# Altium footprint library 11.Other.PcbLib: 23 footprints (part 1 of 2)
Each footprint in its own frame and in the unit in brackets; x right, y up, seen from the top. Pads: shape width x height; smd on the part's side, far side on the other; paste and mask are expansions set on the pad; w line width, h text height; cw(c..) or ccw(c..) is an arc to the next point about the centre after c.
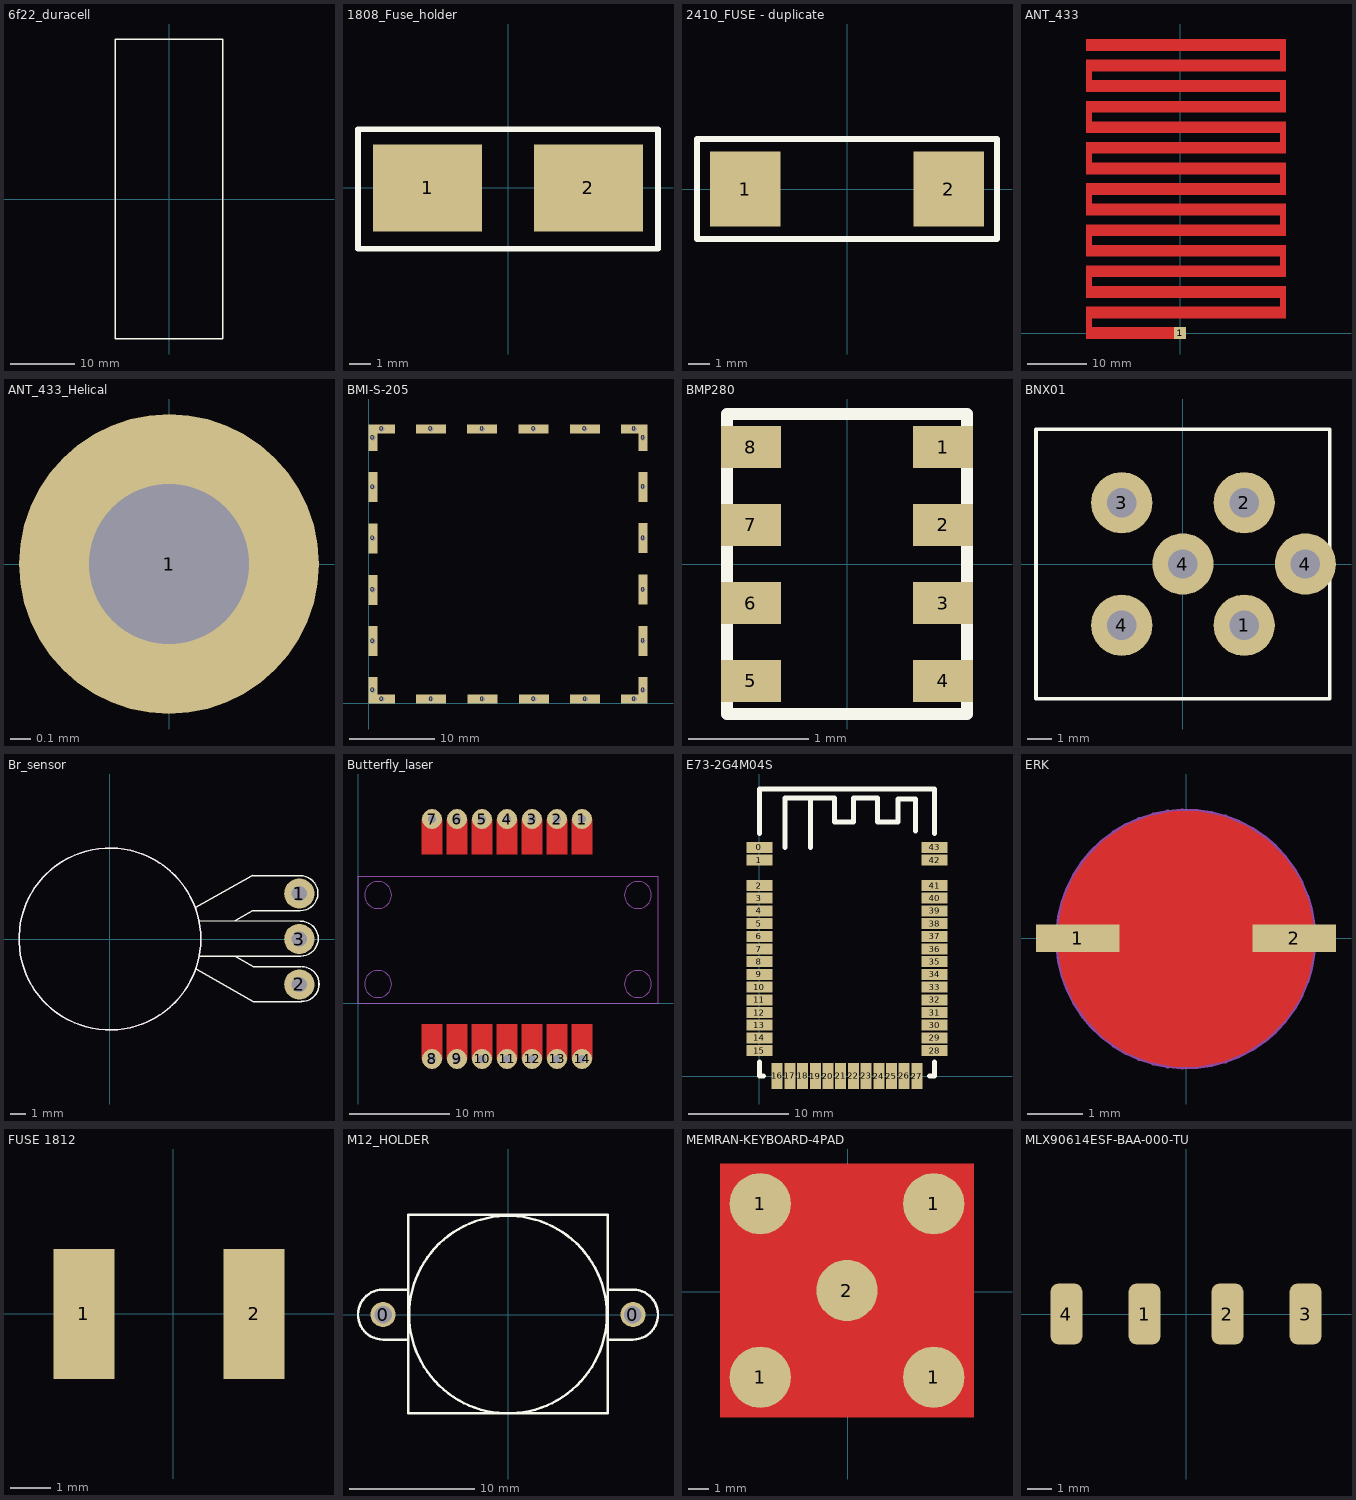
[diagram p0: the footprints below, top view; thin cyan lines are the x and y axes]

## 6f22_duracell [mm]
Top Overlay:
  lines w0.2: -8.4,-21.7 8.3,-21.7 8.3,24.8 -8.4,24.8 -8.4,-21.7
3D body "User Library-9V Duracell Battery.STEP": height 26, standoff 0, extent -8.3,-21.71 8.3,24.8

## 1808_Fuse_holder [mm]
pads (2):
  rect 5x4 smd: 1(-3.7,0) 2(3.7,0)
Top Overlay:
  lines w0.254: -6.9,-2.8 6.9,-2.8 6.9,2.7 -6.9,2.7 -6.9,-2.8
3D body: height 3.81, standoff 0.2, extent -5.3,-2.7 5.3,2.7

## 2410_FUSE - duplicate [mm]
pads (2):
  rect 3.25x3.43 smd: 1(-4.675,0) 2(4.675,0)
Top Overlay:
  lines w0.254: -6.9,-2.3 -6.9,2.3 6.9,2.3 6.9,-2.3 -6.9,-2.3
3D body: height 3.81, standoff 0.2, extent -5.3,-2.7 5.3,2.7

## ANT_433 [mm]
pads (1):
  rect 2x2 smd mask+0.102: 1(0,0)
Top Layer:
  rectangle: -16,2.5 18,4.5
  rectangle: -16,0.5 -15,3
  rectangle: -16,-1 1,1
  rectangle: 17.001,4.061 18.001,6.561
  rectangle: -16,9.5 18,11.5
  rectangle: -16,7.5 -15,10
  rectangle: -16,6 18,8
  rectangle: 17.001,11.061 18.001,13.561
  rectangle: -16,16.5 18,18.5
  rectangle: -16,14.5 -15,17
  rectangle: -16,13 18,15
  rectangle: 17.001,18.061 18.001,20.561
  rectangle: -16,23.5 18,25.5
  rectangle: -16,21.5 -15,24
  rectangle: -16,20 18,22
  rectangle: 17.001,25.061 18.001,27.561
  rectangle: -16,30.5 18,32.5
  rectangle: -16,28.5 -15,31
  rectangle: -16,27 18,29
  rectangle: 17.001,32.061 18.001,34.561
  rectangle: -16,37.5 18,39.5
  rectangle: -16,35.5 -15,38
  rectangle: -16,34 18,36
  rectangle: 17.001,39.061 18.001,41.561
  rectangle: -16,44.5 18,46.5
  rectangle: -16,42.5 -15,45
  rectangle: -16,41 18,43
  rectangle: 17.001,46.061 18.001,48.561
  rectangle: -16,48 18,50

## ANT_433_Helical [mm]
pads (1):
  round 1.5 hole 0.8: 1(0,0)
3D body "User Library-433MHz Antenna Bended.step": height 8.52, standoff 1.27, extent -3.561,-0.5 3.561,51.699

## BMI-S-205 [mm] "BMI-S-205"
pads (24):
  rect 1x3.05 / inner round 1 / far side round 1 hole 0.6: 0(0.5,1.525) 0(0.5,31) 0(32.025,1.525) 0(32.025,31)
  rect 1x3.5 / inner round 1 / far side round 1 hole 0.6: 0(0.5,7.25) 0(0.5,13.25) 0(0.5,19.25) 0(0.5,25.25) 0(32.025,7.275) 0(32.025,13.275) 0(32.025,19.275) 0(32.025,25.275)
  rect 3.05x1 / inner round 1 / far side round 1 hole 0.6: 0(1.525,32.025) 0(1.55,0.5) 0(31,0.5) 0(31,32.025)
  rect 3.5x1 / inner round 1 / far side round 1 hole 0.6: 0(7.25,32.025) 0(7.275,0.5) 0(13.25,32.025) 0(13.275,0.5) 0(19.25,32.025) 0(19.275,0.5) 0(25.25,32.025) 0(25.275,0.5)
3D body "Laird-BMI-S-204-F  AND  BMI-S-204-C.STEP": height 19, standoff 0, extent 0.1,-0.185 32.71,32.425

## BMP280 [mm]
pads (8):
  rect 0.5x0.35 smd: 1(0.8,0.975) 2(0.8,0.325) 3(0.8,-0.325) 4(0.8,-0.975) 5(-0.8,-0.975) 6(-0.8,-0.325) 7(-0.8,0.325) 8(-0.8,0.975)
Top Overlay:
  lines w0.1: -1,-1.25 -1,1.25 1,1.25 1,-1.25 -1,-1.25
Mechanical 13:
  lines w0.1: -1,-1.25 -1,1.25 1,1.25 1,-1.25 -1,-1.25
3D body "Деталь1.STEP": height 0.95, standoff -0.01, extent -1,-1.25 1,1.25

## BNX01 [mm]
pads (6):
  round 2.5 hole 1.2: 1(2.5,-2.5) 2(2.5,2.5) 3(-2.5,2.5) 4(-2.5,-2.5) 4(0,0) 4(5,0)
Top Overlay:
  lines w0.15: 6,-2 6,5.5 -6,5.5 -6,-5.5 6,-5.5 6,-1.5
3D body "User Library-BNX012-01.step": height 8, standoff -4, extent -6,-5.5 6,5.5

## Br_sensor [mm]
pads (3):
  round 2 hole 1: 1(12.5,3) 2(12.5,-3) 3(12.5,0)
Top Overlay:
  circle w0.1: c0,0 r6
  lines w0.1: 5.625,2.05 9.391,4.187 ; 5.7,-2 9.466,-4.137 ; 5.9,1.209 12.575,1.175 ; 5.925,-1.128 12.555,-1.128 ; 8.247,1.212 9.412,1.874 ; 8.322,-1.162 9.487,-1.824 ; 9.4,1.872 12.53,1.872 ; 9.4,4.191 12.55,4.175 ; 9.475,-4.141 12.625,-4.125 ; 9.475,-1.822 12.605,-1.822 ; 12.575,1.875 ccw(c12.575,3.025) 12.575,4.175 ; 12.6,-1.125 ccw(c12.6,0.025) 12.6,1.175 ; 12.65,-4.125 ccw(c12.65,-2.975) 12.65,-1.825
Top 3D Body:
  circle w0.1: c0,0 r6
3D body: height 0.51, standoff 0, extent -6,-6 6,6

## Butterfly_laser [mm]
pads (14):
  round 2 hole 0.8: 1(22.4,18.4) 2(19.9,18.4) 3(17.4,18.4) 4(14.9,18.4) 5(12.4,18.4) 6(9.9,18.4) 7(7.4,18.4) 8(7.4,-5.6) 9(9.9,-5.6) 10(12.4,-5.6) 11(14.9,-5.6) 12(17.4,-5.6) 13(19.9,-5.6) 14(22.4,-5.6)
Top Layer:
  region: 21.4,-2.1 23.4,-2.1 23.4,-5.6 21.4,-5.6
  region: 18.9,-2.1 20.9,-2.1 20.9,-5.6 18.9,-5.6
  region: 16.4,-2.1 18.4,-2.1 18.4,-5.6 16.4,-5.6
  region: 13.9,-2.1 15.9,-2.1 15.9,-5.6 13.9,-5.6
  region: 11.4,-2.1 13.4,-2.1 13.4,-5.6 11.4,-5.6
  region: 8.9,-2.1 10.9,-2.1 10.9,-5.6 8.9,-5.6
  region: 6.4,-2.1 8.4,-2.1 8.4,-5.6 6.4,-5.6
  region: 21.4,18.4 23.4,18.4 23.4,14.9 21.4,14.9
  region: 18.9,18.4 20.9,18.4 20.9,14.9 18.9,14.9
  region: 16.4,18.4 18.4,18.4 18.4,14.9 16.4,14.9
  region: 13.9,18.4 15.9,18.4 15.9,14.9 13.9,14.9
  region: 11.4,18.4 13.4,18.4 13.4,14.9 11.4,14.9
  region: 8.9,18.4 10.9,18.4 10.9,14.9 8.9,14.9
  region: 6.4,18.4 8.4,18.4 8.4,14.9 6.4,14.9
Mechanical 10:
  circle w0.1: c28,10.8 r1.35
  circle w0.1: c28,1.9 r1.35
  circle w0.1: c2,10.8 r1.35
  circle w0.1: c2,1.9 r1.35
  lines w0.1: 0,0 30,0 30,12.7 0,12.7 0,0
3D body "User Library-LC96P.STEP": height 4.18, standoff -3.48, extent 0,-5.747 65.5,18.747

## E73-2G4M04S [mm] "nRF52832 2.4GHz Transceiver Wireless RF module"
height 2.6
pads (44):
  rect 2.6x1.1 smd: 0(-0.008,22.86) 1(-0.008,21.59) 2(-0.008,19.05) 3(-0.008,17.78) 4(-0.008,16.51) 5(-0.008,15.24) 6(-0.008,13.97) 7(-0.008,12.7) 8(-0.008,11.43) 9(-0.008,10.16) 10(-0.008,8.89) 11(-0.008,7.62) 12(-0.008,6.35) 13(-0.008,5.08) 14(-0.008,3.81) 15(-0.008,2.54) 28(17.518,2.54) 29(17.518,3.81) 30(17.518,5.08) 31(17.518,6.35) 32(17.518,7.62) 33(17.518,8.89) 34(17.518,10.16) 35(17.518,11.43) 36(17.518,12.7) 37(17.518,13.97) 38(17.518,15.24) 39(17.518,16.51) 40(17.518,17.78) 41(17.518,19.05) 42(17.518,21.59) 43(17.518,22.86)
  rect 1.1x2.6 smd: 16(1.77,0) 17(3.04,0) 18(4.31,0) 19(5.58,0) 20(6.85,0) 21(8.12,0) 22(9.39,0) 23(10.66,0) 24(11.93,0) 25(13.2,0) 26(14.47,0) 27(15.74,0)
Top Overlay:
  lines w0.5: 0,1.397 0,0 0.381,0 ; 0,24.257 0,28.7 17.526,28.7 17.526,24.257 ; 2.54,22.86 2.54,27.813 5.08,27.813 ; 5.08,22.86 5.08,27.813 ; 15.621,24.511 15.621,27.686 13.843,27.686 13.843,25.4 11.811,25.4 11.811,27.813 9.398,27.813 9.398,25.4 7.493,25.4 7.493,27.813 5.08,27.813 ; 17.018,0 17.526,0 17.526,1.397
3D body "E73.STEP": height 2.5, standoff 0, extent 0.018,0.89 17.518,29.59

## ERK [mm] "SW?"
pads (2):
  rect 1.5x0.5 smd mask+0: 1(-1.95,0) 2(1.95,0)
Top Layer:
  rectangle: 0.075,-1.475 0.475,0.925
  rectangle: -1.025,-1.475 1.575,-1.075
  rectangle: -0.475,-0.925 -0.075,1.475
  rectangle: 1.175,-1.475 1.575,0.925
  rectangle: -1.025,-1.475 -0.625,0.925
  rectangle: -1.575,1.075 1.025,1.475
  rectangle: 0.625,-0.925 1.025,1.475
  rectangle: -1.575,-0.925 -1.175,1.475
  pour cut-out: -2.303,-0.014 -2.303,-0.241 -2.215,-0.685 -2.041,-1.104 -1.79,-1.48 -1.469,-1.801 -1.093,-2.053 -0.674,-2.226 -0.23,-2.314 -0.003,-2.314 0.223,-2.314 0.668,-2.226 1.086,-2.053 1.463,-1.801 1.783,-1.48 2.035,-1.104 2.208,-0.685 2.297,-0.241 2.297,-0.014 2.297,0.212 2.208,0.657 2.035,1.075 1.783,1.452 1.463,1.772 1.086,2.024 0.668,2.197 0.223,2.286 -0.003,2.286 -0.23,2.286 -0.674,2.197 -1.093,2.024 -1.469,1.772 -1.79,1.452 -2.041,1.075 -2.215,0.657 -2.303,0.212
Top Solder:
  region: -2.303,-0.014 -2.303,-0.241 -2.215,-0.685 -2.041,-1.104 -1.79,-1.48 -1.469,-1.801 -1.093,-2.053 -0.674,-2.226 -0.23,-2.314 -0.003,-2.314 0.223,-2.314 0.668,-2.226 1.086,-2.053 1.463,-1.801 1.783,-1.48 2.035,-1.104 2.208,-0.685 2.297,-0.241 2.297,-0.014 2.297,0.212 2.208,0.657 2.035,1.075 1.783,1.452 1.463,1.772 1.086,2.024 0.668,2.197 0.223,2.286 -0.003,2.286 -0.23,2.286 -0.674,2.197 -1.093,2.024 -1.469,1.772 -1.79,1.452 -2.041,1.075 -2.215,0.657 -2.303,0.212
Mechanical 1:
  circle w0.1: c-0.003,-0.014 r2.3

## FUSE 1812 [mm]
pads (2):
  rect 1.5x3.2 smd: 1(-2.2,0) 2(2,0)
3D body "User Library-fuse1812.step": height 1.32, standoff 0, extent -2.51,-1.6 2.31,1.62

## M12_HOLDER [mm]
pads (2):
  round 2 hole 1.4: 0(-10,0) 0(10,0)
Top Overlay:
  circle w0.2: c0,0 r7.906
  lines w0.2: -8.1,-2 -10,-2 cw(c-10,0) -10,2 -8,2 ; 8,2 10,2 cw(c10,0) 10,-2 8.1,-2 ; -8,-7.9 -8,8 8,8 8,-7.9 -8,-7.9
3D body "M12 lens holder.STEP": height 14.9, standoff 0.1, extent -12,-8 12,8

## MEMRAN-KEYBOARD-4PAD [mm] "пад мембранной клавиатуры"
pads (5):
  round 3 smd paste+0 mask+0: 1(-4.275,-4.2) 1(-4.275,4.3) 1(4.225,-4.2) 1(4.225,4.3) 2(-0.025,0.05)
Top Layer:
  rectangle: 4.075,-4.35 4.375,4.15
  region: 4.225,-4.35 4.225,-4.05 -4.275,-4.05 -4.275,-4.35
  rectangle: -4.425,-4.2 -4.125,4.3
  pour cut-out: -6.225,6.25 -6.225,-6.15 6.175,-6.15 6.175,6.25
Top Solder:
  region: -6.225,6.25 -6.225,-6.15 6.175,-6.15 6.175,6.25

## MLX90614ESF-BAA-000-TU [mm]
pads (4):
  rrect50% 1.3x2.5 smd: 1(-1.7,0) 2(1.7,0) 3(4.9,0) 4(-4.9,0)